# Altium footprint library eLIB.PcbLib: 206 footprints (part 6 of 13) (continued)
## LOGO KAVAN [mm] (continued)
  lines w0.051: -4.668,2.546 -2.027,2.546 ; -4.617,2.596 -2.027,2.596 ; -4.617,2.647 -1.976,2.647 ; -4.567,2.698 -1.976,2.698 ; -4.567,2.749 -1.925,2.749 ; -4.516,2.8 -1.925,2.8 ; -4.516,2.85 -1.874,2.85 ; -4.465,2.901 -1.874,2.901 ; -4.465,2.952 -1.823,2.952 ; -4.414,3.003 -1.823,3.003 ; -4.414,3.054 -1.773,3.054 ; -4.363,3.104 -1.773,3.104 ; -4.363,3.155 -1.722,3.155 ; -4.313,3.206 -1.722,3.206 ; -4.313,3.257 -1.671,3.257 ; -4.262,3.308 -1.671,3.308 ; -4.262,3.358 -1.62,3.358 ; -4.211,3.409 -1.62,3.409 ; -4.211,3.46 -1.569,3.46 ; -4.16,3.511 -1.569,3.511 ; -4.16,3.562 -1.519,3.562 ; -4.109,3.612 -1.519,3.612 ; -4.109,3.663 -1.468,3.663 ; -4.059,3.714 -1.468,3.714 ; -4.059,3.765 -1.417,3.765 ; -4.008,3.816 -1.366,3.816 ; -4.008,3.866 -1.366,3.866 ; -3.957,3.917 -1.315,3.917 ; -3.957,3.968 -1.315,3.968 ; -3.906,4.019 -1.265,4.019 ; -3.906,4.07 -1.265,4.07 ; -3.855,4.12 -1.214,4.12 ; -3.855,4.171 -1.214,4.171 ; -3.855,4.222 -1.163,4.222 ; -3.805,4.273 -1.163,4.273 ; -3.805,4.324 -1.112,4.324 ; -3.754,4.374 -1.112,4.374 ; -3.754,4.425 -1.061,4.425 ; -3.703,4.476 -1.061,4.476 ; -3.703,4.527 -1.011,4.527 ; -3.652,4.578 -1.011,4.578 ; -3.652,4.628 -0.96,4.628 ; -3.601,4.679 -0.96,4.679 ; -3.601,4.73 -0.909,4.73 ; -3.551,4.781 -0.909,4.781 ; -3.551,4.832 -0.858,4.832 ; -3.5,4.882 -0.858,4.882 ; -3.5,4.933 -0.807,4.933 ; -3.449,4.984 -0.807,4.984 ; -3.449,5.035 -0.757,5.035 ; -3.398,5.086 -0.757,5.086 ; -3.398,5.136 -0.706,5.136 ; -3.347,5.187 -0.706,5.187 ; -3.347,5.238 -0.655,5.238 ; -3.043,-0.147 -0.452,-0.147 ; -2.992,-0.096 -0.401,-0.096 ; -2.992,-0.045 -0.401,-0.045 ; -2.941,0.006 -0.35,0.006 ; -2.941,0.056 -0.35,0.056 ; -2.89,0.107 -0.299,0.107 ; -2.89,0.158 -0.299,0.158 ; -2.839,0.209 -0.249,0.209 ; -2.839,0.26 -0.249,0.26 ; -2.789,0.31 -0.198,0.31 ; -2.789,0.361 -0.198,0.361 ; -2.738,0.412 -0.147,0.412 ; -2.738,0.463 -0.147,0.463 ; -2.687,0.514 -0.096,0.514 ; -2.687,0.564 -0.096,0.564 ; -2.636,0.615 -0.045,0.615 ; -2.636,0.666 -0.045,0.666 ; -2.585,0.717 0.005,0.717 ; -2.585,0.768 0.005,0.768 ; -2.535,0.818 0.056,0.818 ; -2.535,0.869 0.056,0.869 ; -2.484,0.92 0.107,0.92 ; -2.484,0.971 0.107,0.971 ; -2.433,1.022 0.158,1.022 ; -2.433,1.072 0.158,1.072 ; -2.382,1.123 0.209,1.123 ; -2.382,1.174 0.209,1.174 ; -2.331,1.225 0.259,1.225 ; -2.331,1.276 0.259,1.276 ; -2.281,1.326 0.31,1.326 ; -2.281,1.377 0.31,1.377 ; -2.23,1.428 0.361,1.428 ; -2.23,1.479 0.361,1.479 ; -2.179,1.53 0.412,1.53 ; -2.179,1.58 0.412,1.58 ; -2.128,1.631 0.463,1.631 ; -2.128,1.682 0.463,1.682 ; -2.077,1.733 0.513,1.733 ; -2.077,1.784 0.513,1.784 ; -2.027,1.834 0.564,1.834 ; -2.027,1.885 0.564,1.885 ; -1.976,1.936 0.615,1.936 ; -1.976,1.987 0.615,1.987 ; -1.925,2.038 0.666,2.038 ; -1.925,2.088 0.666,2.088 ; -1.874,2.139 0.717,2.139 ; -1.874,2.19 0.717,2.19 ; -1.823,2.241 0.767,2.241 ; -1.823,2.292 0.767,2.292 ; -1.773,2.342 0.818,2.342 ; -1.773,2.393 0.818,2.393 ; -1.722,2.444 0.869,2.444 ; -1.722,2.495 0.869,2.495 ; -1.671,2.546 0.92,2.546 ; -1.671,2.596 0.971,2.596 ; -1.62,2.647 0.971,2.647 ; -1.62,2.698 1.021,2.698 ; -1.569,2.749 1.021,2.749 ; -1.569,2.8 1.072,2.8 ; -1.519,2.85 1.072,2.85 ; -1.519,2.901 1.123,2.901 ; -1.468,2.952 1.123,2.952 ; -1.468,3.003 1.174,3.003 ; -1.417,3.054 1.174,3.054 ; -1.417,3.104 1.225,3.104 ; -1.366,-2.89 1.275,-2.89 ; -1.366,3.155 1.225,3.155 ; -1.366,3.206 1.275,3.206 ; -1.315,-2.839 1.326,-2.839 ; -1.315,-2.788 1.326,-2.788 ; -1.315,3.257 1.275,3.257 ; -1.315,3.308 1.326,3.308 ; -1.265,-2.738 1.377,-2.738 ; -1.265,-2.687 1.377,-2.687 ; -1.265,3.358 1.326,3.358 ; -1.265,3.409 1.377,3.409 ; -1.214,-2.636 1.428,-2.636 ; -1.214,-2.585 1.428,-2.585 ; -1.214,3.46 1.377,3.46 ; -1.214,3.511 1.428,3.511 ; -1.163,-2.534 1.479,-2.534 ; -1.163,-2.484 1.479,-2.484 ; -1.163,3.562 1.428,3.562 ; -1.163,3.612 1.479,3.612 ; -1.112,-2.433 1.479,-2.433 ; -1.112,-2.382 1.529,-2.382 ; -1.112,3.663 1.479,3.663 ; -1.112,3.714 1.529,3.714 ; -1.061,-2.331 1.529,-2.331 ; -1.061,-2.28 1.58,-2.28 ; -1.061,3.765 1.529,3.765 ; -1.061,3.816 1.58,3.816 ; -1.011,-2.23 1.58,-2.23 ; -1.011,-2.179 1.631,-2.179 ; -1.011,3.866 1.58,3.866 ; -1.011,3.917 1.631,3.917 ; -0.96,-2.128 1.631,-2.128 ; -0.96,-2.077 1.682,-2.077 ; -0.96,3.968 1.631,3.968 ; -0.96,4.019 1.682,4.019 ; -0.909,-2.026 1.682,-2.026 ; -0.909,-1.976 1.733,-1.976 ; -0.909,4.07 1.682,4.07 ; -0.909,4.12 1.733,4.12 ; -0.858,-1.925 1.733,-1.925 ; -0.858,-1.874 1.783,-1.874 ; -0.858,4.171 1.733,4.171 ; -0.858,4.222 1.783,4.222 ; -0.807,-1.823 1.783,-1.823 ; -0.807,-1.772 1.834,-1.772 ; -0.807,4.273 1.783,4.273 ; -0.807,4.324 1.834,4.324 ; -0.757,-1.722 1.834,-1.722 ; -0.757,-1.671 1.885,-1.671 ; -0.757,4.374 1.834,4.374 ; -0.757,4.425 1.885,4.425 ; -0.706,-1.62 1.936,-1.62 ; -0.706,-1.569 1.936,-1.569 ; -0.706,4.476 1.885,4.476 ; -0.706,4.527 1.936,4.527 ; -0.655,-1.518 1.987,-1.518 ; -0.655,-1.468 1.987,-1.468 ; -0.655,4.578 1.936,4.578 ; -0.655,4.628 1.987,4.628 ; -0.604,-1.417 2.037,-1.417 ; -0.604,-1.366 2.037,-1.366 ; -0.604,-1.315 2.088,-1.315 ; -0.604,4.679 1.987,4.679 ; -0.604,4.73 2.037,4.73 ; -0.553,-1.264 2.088,-1.264 ; -0.553,-1.214 2.139,-1.214 ; -0.553,4.781 2.037,4.781 ; -0.553,4.832 2.088,4.832 ; -0.503,-1.163 2.139,-1.163 ; -0.503,-1.112 2.19,-1.112 ; -0.503,4.882 2.088,4.882 ; -0.503,4.933 2.139,4.933 ; -0.452,-1.061 2.19,-1.061 ; -0.452,-1.01 2.241,-1.01 ; -0.452,4.984 2.139,4.984 ; -0.452,5.035 2.19,5.035 ; -0.401,-0.96 2.241,-0.96 ; -0.401,-0.909 2.291,-0.909 ; -0.401,5.086 2.19,5.086 ; -0.401,5.136 2.241,5.136 ; -0.35,-0.858 2.291,-0.858 ; -0.35,-0.807 2.342,-0.807 ; -0.35,5.187 2.241,5.187 ; -0.35,5.238 2.291,5.238 ; -0.299,-0.756 2.342,-0.756 ; -0.299,-0.706 2.393,-0.706 ; -0.249,-0.655 2.393,-0.655 ; -0.249,-0.604 2.444,-0.604 ; -0.198,-0.553 2.444,-0.553 ; -0.198,-0.502 2.495,-0.502 ; -0.147,-0.452 2.495,-0.452 ; -0.147,-0.401 2.545,-0.401 ; -0.096,-0.35 2.545,-0.35 ; -0.096,-0.299 2.596,-0.299 ; -0.045,-0.248 2.596,-0.248 ; -0.045,-0.198 2.647,-0.198 ; 0.005,-0.147 2.647,-0.147 ; 0.005,-0.096 2.698,-0.096 ; 0.056,-0.045 2.698,-0.045 ; 0.056,0.006 2.749,0.006 ; 0.107,0.056 2.749,0.056 ; 0.107,0.107 2.799,0.107 ; 0.158,0.158 2.799,0.158 ; 0.158,0.209 2.85,0.209 ; 0.209,0.26 2.85,0.26 ; 0.209,0.31 2.901,0.31 ; 0.259,0.361 2.901,0.361 ; 0.259,0.412 2.952,0.412 ; 0.31,0.463 2.952,0.463 ; 0.31,0.514 3.003,0.514 ; 0.361,0.564 3.003,0.564 ; 0.361,0.615 3.053,0.615 ; 0.412,0.666 3.053,0.666 ; 0.412,0.717 3.104,0.717 ; 0.463,0.768 3.104,0.768 ; 0.463,0.818 3.155,0.818 ; 0.513,0.869 3.155,0.869 ; 0.513,0.92 3.206,0.92 ; 0.564,0.971 3.206,0.971 ; 0.564,1.022 3.257,1.022 ; 0.615,1.072 3.257,1.072 ; 0.615,1.123 3.307,1.123 ; 0.666,1.174 3.307,1.174 ; 0.666,1.225 3.358,1.225 ; 0.666,1.276 3.358,1.276 ; 0.717,1.326 3.409,1.326 ; 0.717,1.377 3.409,1.377 ; 0.767,1.428 3.46,1.428 ; 0.767,1.479 3.46,1.479 ; 0.818,1.53 3.511,1.53 ; 0.818,1.58 3.511,1.58 ; 0.869,1.631 3.561,1.631 ; 0.869,1.682 3.561,1.682 ; 0.92,1.733 3.612,1.733 ; 0.92,1.784 3.612,1.784 ; 0.971,1.834 3.663,1.834 ; 0.971,1.885 3.663,1.885 ; 1.021,1.936 3.714,1.936 ; 1.021,1.987 3.714,1.987 ; 1.072,2.038 3.765,2.038 ; 1.072,2.088 3.765,2.088 ; 1.123,2.139 3.815,2.139 ; 1.123,2.19 3.815,2.19 ; 1.174,2.241 3.866,2.241 ; 1.174,2.292 3.866,2.292 ; 1.225,2.342 3.917,2.342 ; 1.225,2.393 3.917,2.393 ; 1.275,2.444 3.968,2.444 ; 1.275,2.495 3.968,2.495 ; 1.326,2.546 4.019,2.546 ; 1.326,2.596 4.019,2.596 ; 1.377,2.647 4.069,2.647 ; 1.377,2.698 4.069,2.698 ; 1.428,2.749 4.12,2.749 ; 1.428,2.8 4.12,2.8 ; 1.479,2.85 4.171,2.85 ; 1.479,2.901 4.171,2.901 ; 1.529,2.952 4.222,2.952 ; 1.529,3.003 4.222,3.003 ; 1.58,3.054 4.273,3.054 ; 1.58,3.104 4.273,3.104 ; 1.631,3.155 4.323,3.155 ; 1.631,3.206 4.323,3.206 ; 1.682,3.257 4.374,3.257 ; 1.682,3.308 4.374,3.308 ; 1.733,3.358 4.425,3.358 ; 1.733,3.409 4.425,3.409 ; 1.783,3.46 4.476,3.46 ; 1.783,3.511 4.476,3.511 ; 1.834,3.562 4.527,3.562 ; 1.834,3.612 4.527,3.612 ; 1.885,3.663 4.577,3.663 ; 1.885,3.714 4.577,3.714 ; 1.936,3.765 4.628,3.765 ; 1.987,3.816 4.628,3.816 ; 1.987,3.866 4.679,3.866 ; 2.037,3.917 4.679,3.917 ; 2.037,3.968 4.73,3.968 ; 2.088,4.019 4.73,4.019 ; 2.088,4.07 4.781,4.07 ; 2.139,4.12 4.781,4.12 ; 2.139,4.171 4.831,4.171 ; 2.19,4.222 4.831,4.222 ; 2.19,4.273 4.882,4.273 ; 2.241,4.324 4.882,4.324 ; 2.241,4.374 4.933,4.374 ; 2.291,4.425 4.933,4.425 ; 2.291,4.476 4.984,4.476 ; 2.342,4.527 4.984,4.527 ; 2.342,4.578 5.035,4.578 ; 2.393,4.628 5.035,4.628 ; 2.393,4.679 5.085,4.679 ; 2.444,4.73 5.085,4.73 ; 2.444,4.781 5.136,4.781 ; 2.495,4.832 5.136,4.832 ; 2.495,4.882 5.187,4.882 ; 2.545,4.933 5.187,4.933 ; 2.545,4.984 5.238,4.984 ; 2.596,5.035 5.238,5.035 ; 2.596,5.086 5.289,5.086 ; 2.647,5.136 5.289,5.136 ; 2.647,5.187 5.339,5.187 ; 2.647,5.238 5.339,5.238
Top Solder:
  drawing of 949 lines, arcs and shapes, not listed

## LORA-RA02 [mm] "SOP, 16-Leads, Body 17.00x14.00mm, Pitch 2.00mm, IPC Medium Density"
height 3
pads (16):
  oval 3x1.15 smd: 1(-8.5,7) 2(-8.5,5) 3(-8.5,3) 4(-8.5,1) 5(-8.5,-1) 6(-8.5,-3) 7(-8.5,-5) 8(-8.5,-7) 9(8.5,-7) 10(8.5,-5) 11(8.5,-3) 12(8.5,-1) 13(8.5,1) 14(8.5,3) 15(8.5,5) 16(8.5,7)
Top Overlay:
  circle w0.25: c-7.725,8.125 r0.125
  circle w0.6: c-5.6,7.5 r0.3
  lines w0.2: -6.6,-8.5 -6.6,8.5 6.6,8.5 6.6,-8.5 -6.6,-8.5
Mechanical 13:
  circle w0.1: c-6.1,7.6 r0.5
  lines w0.1: -7,-8.5 -7,8.5 7,8.5 7,-8.5 -7,-8.5
Mechanical 15:
  lines w0.05: -8.675,-8.75 -8.675,8.75 8.675,8.75 8.675,-8.75 -8.675,-8.75
  lines w0.1: -0.5,0 0.5,0 ; 0,-0.5 0,0.5
3D body "loraRA-02-1.STEP": height 3.2, standoff 0, extent -8,-8.5 8,8.5

## LQFP, 64 [mm] "LQFP, 64-Leads, Body 10.00x10.00mm, Pitch 0.50mm, IPC Medium Density"
height 1.6
pads (64):
  oval 1.4x0.3 smd: 1(-5.7,3.75) 2(-5.7,3.25) 3(-5.7,2.75) 4(-5.7,2.25) 5(-5.7,1.75) 6(-5.7,1.25) 7(-5.7,0.75) 8(-5.7,0.25) 9(-5.7,-0.25) 10(-5.7,-0.75) 11(-5.7,-1.25) 12(-5.7,-1.75) 13(-5.7,-2.25) 14(-5.7,-2.75) 15(-5.7,-3.25) 16(-5.7,-3.75) 33(5.7,-3.75) 34(5.7,-3.25) 35(5.7,-2.75) 36(5.7,-2.25) 37(5.7,-1.75) 38(5.7,-1.25) 39(5.7,-0.75) 40(5.7,-0.25) 41(5.7,0.25) 42(5.7,0.75) 43(5.7,1.25) 44(5.7,1.75) 45(5.7,2.25) 46(5.7,2.75) 47(5.7,3.25) 48(5.7,3.75)
  oval 0.3x1.4 smd: 17(-3.75,-5.7) 18(-3.25,-5.7) 19(-2.75,-5.7) 20(-2.25,-5.7) 21(-1.75,-5.7) 22(-1.25,-5.7) 23(-0.75,-5.7) 24(-0.25,-5.7) 25(0.25,-5.7) 26(0.75,-5.7) 27(1.25,-5.7) 28(1.75,-5.7) 29(2.25,-5.7) 30(2.75,-5.7) 31(3.25,-5.7) 32(3.75,-5.7) 49(3.75,5.7) 50(3.25,5.7) 51(2.75,5.7) 52(2.25,5.7) 53(1.75,5.7) 54(1.25,5.7) 55(0.75,5.7) 56(0.25,5.7) 57(-0.25,5.7) 58(-0.75,5.7) 59(-1.25,5.7) 60(-1.75,5.7) 61(-2.25,5.7) 62(-2.75,5.7) 63(-3.25,5.7) 64(-3.75,5.7)
Top Overlay:
  circle w0.6: c-3.6,3.6 r0.3
  circle w0.25: c-5.7,4.45 r0.125
  lines w0.2: -4.6,-4.6 4.6,-4.6 4.6,4.6 -4.6,4.6 -4.6,-4.6
Mechanical 13:
  circle w0.1: c-4.1,4.1 r0.5
  lines w0.1: -5,-5 5,-5 5,5 -5,5 -5,-5
Mechanical 15:
  lines w0.05: -6.65,-6.65 6.65,-6.65 6.65,6.65 -6.65,6.65 -6.65,-6.65
  lines w0.1: -0.5,0 0.5,0 ; 0,-0.5 0,0.5
3D body "User Library-STM32-LQFP64 10mm x 10mm.STEP": height 1.6, standoff 0.01, extent -5.999,-5.999 5.999,5.999

## LTC1733 [mm] "Battery charger 1A MSOP"
pads (11):
  oval 1.1x0.33 smd: 1(-2.4,1) 2(-2.4,0.5) 3(-2.4,0) 4(-2.4,-0.5) 5(-2.4,-1) 6(2.4,-1) 7(2.4,-0.5) 8(2.4,0) 9(2.4,0.5) 10(2.4,1)
  rect 2.162x1.932 smd: 11(0,0)
Top Overlay:
  lines w0.15: -1.49,-1.25 -1.49,1.25 0.125,1.25 1.49,1.25 1.49,-1.25 -1.49,-1.25
3D body: height 0, standoff 0, extent -1.565,-1.325 1.565,1.325
3D body: height 0, standoff 0, extent -1.489,-1.249 1.489,1.249
3D body: height 0, standoff 0, extent -2.702,-1.252 2.702,1.252
3D body "User Library-MSOP-10-1.STEP": height 1.05, standoff 0, extent -2.514,-1.5 2.514,1.5

## M93C46 [mm] "SOIC, 8-Leads, Body 4.90x3.90mm, Pitch 1.27mm, IPC Medium Density"
height 1.75
pads (8):
  oval 1.45x0.6 smd: 1(-2.725,1.905) 2(-2.725,0.635) 3(-2.725,-0.635) 4(-2.725,-1.905) 5(2.725,-1.905) 6(2.725,-0.635) 7(2.725,0.635) 8(2.725,1.905)
Top Overlay:
  circle w0.6: c-0.6,1.5 r0.3
  circle w0.25: c-2.725,2.755 r0.125
  lines w0.2: -1.6,-2.5 1.6,-2.5 1.6,2.5 -1.6,2.5 -1.6,-2.5
Mechanical 13:
  circle w0.1: c-1.1,1.6 r0.5
  lines w0.1: -2,-2.5 2,-2.5 2,2.5 -2,2.5 -2,-2.5
Mechanical 15:
  lines w0.05: -3.7,-2.75 3.7,-2.75 3.7,2.75 -3.7,2.75 -3.7,-2.75
  lines w0.1: -0.5,0 0.5,0 ; 0,-0.5 0,0.5
3D body: height 1.75, standoff 0.1, extent -2,-2.5 2,2.5